# Altium schematic symbol library jlcpcb_2025_04_inductors_extended_0805.schlib: 882 symbols (part 1 of 5) (continued)
## CMI201209X5R6KT
designator L?  Inductance: 5.6uH
Inductor, 5.6uH, ±10%, 1Ω, 25mA, SMD 0805; Manufacturer: FH(Guangdong Fenghua Advanced Tech); Manufacturer Part Number: CMI201209X5R6KT; Self-Resonant Frequency: 32MHz; Q Factor: 30@4MHz; Package Size: 0805; JLCPCB Basic Part: No; JLCPCB Part Number: C1045; Supplier 1: LCSC; Category: Inductors; Supplier Part Number 1: C1045; Tolerance: ±10%; Rated Current: 25mA; DC Resistance: 1Ω; RoHS: Yes; ComponentLink1Description: Datasheet; ComponentLink1URL: https://wmsc.lcsc.com/wmsc/upload/file/pdf/v2/lcsc/2302231101_FH--Guangdong-Fenghua-Advanced-Tech-CMI201209X5R6KT_C1045.pdf; ComponentLink2Description: JLCPCB Part URL; ComponentLink2URL: https://jlcpcb.com/partdetail/C1045; ComponentLink3Description: LCSC Part URL; ComponentLink3URL: https://lcsc.com/product-detail/Inductors-SMD_FH-Guangdong-Fenghua-Advanced-Tech-FH-Guangdong-Fenghua-Advanced-Tech-CMI201209X5R6KT_C1045.html
footprint IND-0805 (0805 (2012M) Inductor)
pins: 1, 2

## CMI201209X6R8KT
designator L?  Inductance: 6.8uH
Inductor, 6.8uH, ±10%, 1.05Ω, 15mA, SMD 0805; Manufacturer: FH(Guangdong Fenghua Advanced Tech); Manufacturer Part Number: CMI201209X6R8KT; Self-Resonant Frequency: 29MHz; Q Factor: 30@4MHz; Package Size: 0805; JLCPCB Basic Part: No; JLCPCB Part Number: C139232; Supplier 1: LCSC; Category: Inductors; Supplier Part Number 1: C139232; Tolerance: ±10%; Rated Current: 15mA; DC Resistance: 1.05Ω; RoHS: Yes; ComponentLink1Description: Datasheet; ComponentLink1URL: https://wmsc.lcsc.com/wmsc/upload/file/pdf/v2/lcsc/2302231230_FH--Guangdong-Fenghua-Advanced-Tech-CMI201209X6R8KT_C139232.pdf; ComponentLink2Description: JLCPCB Part URL; ComponentLink2URL: https://jlcpcb.com/partdetail/C139232; ComponentLink3Description: LCSC Part URL; ComponentLink3URL: https://lcsc.com/product-detail/Inductors-SMD_FH-Guangdong-Fenghua-Advanced-Tech-FH-Guangdong-Fenghua-Advanced-Tech-CMI201209X6R8KT_C139232.html
footprint IND-0805 (0805 (2012M) Inductor)
pins: 1, 2

## CMI201209X8R2KT
designator L?  Inductance: 8.2uH
Inductor, 8.2uH, ±10%, 1.05Ω, 5mA, SMD 0805; Manufacturer: FH(Guangdong Fenghua Advanced Tech); Manufacturer Part Number: CMI201209X8R2KT; Self-Resonant Frequency: 26MHz; Q Factor: 30@4MHz; Package Size: 0805; JLCPCB Basic Part: No; JLCPCB Part Number: C139233; Supplier 1: LCSC; Category: Inductors; Supplier Part Number 1: C139233; Tolerance: ±10%; Rated Current: 5mA; DC Resistance: 1.05Ω; RoHS: Yes; ComponentLink1Description: Datasheet; ComponentLink1URL: https://wmsc.lcsc.com/wmsc/upload/file/pdf/v2/lcsc/2302231230_FH--Guangdong-Fenghua-Advanced-Tech-CMI201209X8R2KT_C139233.pdf; ComponentLink2Description: JLCPCB Part URL; ComponentLink2URL: https://jlcpcb.com/partdetail/C139233; ComponentLink3Description: LCSC Part URL; ComponentLink3URL: https://lcsc.com/product-detail/Inductors-SMD_FH-Guangdong-Fenghua-Advanced-Tech-FH-Guangdong-Fenghua-Advanced-Tech-CMI201209X8R2KT_C139233.html
footprint IND-0805 (0805 (2012M) Inductor)
pins: 1, 2

## CMI201209X100KT
designator L?  Inductance: 10uH
Inductor, 10uH, ±10%, 1.15Ω, 15mA, SMD 0805; Manufacturer: FH(Guangdong Fenghua Advanced Tech); Manufacturer Part Number: CMI201209X100KT; Self-Resonant Frequency: 24MHz; Q Factor: 30@2MHz; Package Size: 0805; JLCPCB Basic Part: No; JLCPCB Part Number: C99366; Supplier 1: LCSC; Category: Inductors; Supplier Part Number 1: C99366; Tolerance: ±10%; Rated Current: 15mA; DC Resistance: 1.15Ω; RoHS: Yes; ComponentLink1Description: Datasheet; ComponentLink1URL: https://wmsc.lcsc.com/wmsc/upload/file/pdf/v2/lcsc/2302231230_FH--Guangdong-Fenghua-Advanced-Tech-CMI201209X100KT_C99366.pdf; ComponentLink2Description: JLCPCB Part URL; ComponentLink2URL: https://jlcpcb.com/partdetail/C99366; ComponentLink3Description: LCSC Part URL; ComponentLink3URL: https://lcsc.com/product-detail/Inductors-SMD_FH-Guangdong-Fenghua-Advanced-Tech-FH-Guangdong-Fenghua-Advanced-Tech-CMI201209X100KT_C99366.html
footprint IND-0805 (0805 (2012M) Inductor)
pins: 1, 2

## CMI201209X120KT
designator L?  Inductance: 12uH
Inductor, 12uH, ±10%, 1.15Ω, 15mA, SMD 0805; Manufacturer: FH(Guangdong Fenghua Advanced Tech); Manufacturer Part Number: CMI201209X120KT; Self-Resonant Frequency: 22MHz; Q Factor: 30@2MHz; Package Size: 0805; JLCPCB Basic Part: No; JLCPCB Part Number: C268319; Supplier 1: LCSC; Category: Inductors; Supplier Part Number 1: C268319; Tolerance: ±10%; Rated Current: 15mA; DC Resistance: 1.15Ω; RoHS: Yes; ComponentLink1Description: Datasheet; ComponentLink1URL: https://wmsc.lcsc.com/wmsc/upload/file/pdf/v2/lcsc/2302231230_FH--Guangdong-Fenghua-Advanced-Tech-CMI201209X120KT_C268319.pdf; ComponentLink2Description: JLCPCB Part URL; ComponentLink2URL: https://jlcpcb.com/partdetail/C268319; ComponentLink3Description: LCSC Part URL; ComponentLink3URL: https://lcsc.com/product-detail/Inductors-SMD_FH-Guangdong-Fenghua-Advanced-Tech-FH-Guangdong-Fenghua-Advanced-Tech-CMI201209X120KT_C268319.html
footprint IND-0805 (0805 (2012M) Inductor)
pins: 1, 2

## CMI201212J390KT
designator L?  Inductance: 39uH
Inductor, 39uH, ±10%, SMD 0805; Manufacturer: FH (Guangdong Fenghua Advanced Tech); Manufacturer Part Number: CMI201212J390KT; Package Size: 0805; JLCPCB Basic Part: No; JLCPCB Part Number: C394973; Supplier 1: LCSC; Category: Inductors; Supplier Part Number 1: C394973; Tolerance: ±10%; RoHS: Yes; ComponentLink1Description: Datasheet; ComponentLink1URL: https://wmsc.lcsc.com/wmsc/upload/file/pdf/v2/lcsc/2302231030_FH--Guangdong-Fenghua-Advanced-Tech-CMI201212J390KT_C394973.pdf; ComponentLink2Description: JLCPCB Part URL; ComponentLink2URL: https://jlcpcb.com/partdetail/C394973; ComponentLink3Description: LCSC Part URL; ComponentLink3URL: https://lcsc.com/product-detail/Inductors-SMD_FH-Guangdong-Fenghua-Advanced-Tech-FH-Guangdong-Fenghua-Advanced-Tech-CMI201212J390KT_C394973.html
footprint IND-0805 (0805 (2012M) Inductor)
pins: 1, 2

## CMI201212J470KT
designator L?  Inductance: 47uH
Inductor, 47uH, ±10%, SMD 0805; Manufacturer: FH(Guangdong Fenghua Advanced Tech); Manufacturer Part Number: CMI201212J470KT; Package Size: 0805; JLCPCB Basic Part: No; JLCPCB Part Number: C105499; Supplier 1: LCSC; Category: Inductors; Supplier Part Number 1: C105499; Tolerance: ±10%; RoHS: Yes; ComponentLink1Description: Datasheet; ComponentLink1URL: https://wmsc.lcsc.com/wmsc/upload/file/pdf/v2/lcsc/2302231030_FH--Guangdong-Fenghua-Advanced-Tech-CMI201212J470KT_C105499.pdf; ComponentLink2Description: JLCPCB Part URL; ComponentLink2URL: https://jlcpcb.com/partdetail/C105499; ComponentLink3Description: LCSC Part URL; ComponentLink3URL: https://lcsc.com/product-detail/Inductors-SMD_FH-Guangdong-Fenghua-Advanced-Tech-FH-Guangdong-Fenghua-Advanced-Tech-CMI201212J470KT_C105499.html
footprint IND-0805 (0805 (2012M) Inductor)
pins: 1, 2

## CMP201209JD150MT
designator L?  Inductance: 15uH
Inductor, 15uH, ±20%, 650mΩ, 100mA, SMD 0805; Manufacturer: FH (Guangdong Fenghua Advanced Tech); Manufacturer Part Number: CMP201209JD150MT; Self-Resonant Frequency: 19MHz; Package Size: 0805; JLCPCB Basic Part: No; JLCPCB Part Number: C5344252; Supplier 1: LCSC; Category: Inductors; Supplier Part Number 1: C5344252; Tolerance: ±20%; Rated Current: 100mA; DC Resistance: 650mΩ; RoHS: Yes; ComponentLink1Description: Datasheet; ComponentLink1URL: https://wmsc.lcsc.com/wmsc/upload/file/pdf/v2/lcsc/2302231130_FH--Guangdong-Fenghua-Advanced-Tech-CMP201209JD150MT_C5344252.pdf; ComponentLink2Description: JLCPCB Part URL; ComponentLink2URL: https://jlcpcb.com/partdetail/C5344252; ComponentLink3Description: LCSC Part URL; ComponentLink3URL: https://lcsc.com/product-detail/Inductors-SMD_FH-Guangdong-Fenghua-Advanced-Tech-FH-Guangdong-Fenghua-Advanced-Tech-CMP201209JD150MT_C5344252.html
footprint IND-0805 (0805 (2012M) Inductor)
pins: 1, 2

## CMP201209JE220MT
designator L?  Inductance: 22uH
Inductor, 22uH, ±20%, 750mΩ, 50mA, SMD 0805; Manufacturer: FH(Guangdong Fenghua Advanced Tech); Manufacturer Part Number: CMP201209JE220MT; Self-Resonant Frequency: 16MHz; Package Size: 0805; JLCPCB Basic Part: No; JLCPCB Part Number: C395011; Supplier 1: LCSC; Category: Inductors; Supplier Part Number 1: C395011; Tolerance: ±20%; Rated Current: 50mA; DC Resistance: 750mΩ; RoHS: Yes; ComponentLink1Description: Datasheet; ComponentLink1URL: https://wmsc.lcsc.com/wmsc/upload/file/pdf/v2/lcsc/2302231030_FH--Guangdong-Fenghua-Advanced-Tech-CMP201209JE220MT_C395011.pdf; ComponentLink2Description: JLCPCB Part URL; ComponentLink2URL: https://jlcpcb.com/partdetail/C395011; ComponentLink3Description: LCSC Part URL; ComponentLink3URL: https://lcsc.com/product-detail/Inductors-SMD_FH-Guangdong-Fenghua-Advanced-Tech-FH-Guangdong-Fenghua-Advanced-Tech-CMP201209JE220MT_C395011.html
footprint IND-0805 (0805 (2012M) Inductor)
pins: 1, 2

## CMP201209UD1R0KT
designator L?  Inductance: 1uH
Inductor, 1uH, ±10%, SMD 0805; Manufacturer: FH(Guangdong Fenghua Advanced Tech); Manufacturer Part Number: CMP201209UD1R0KT; Package Size: 0805; JLCPCB Basic Part: No; JLCPCB Part Number: C395012; Supplier 1: LCSC; Category: Inductors; Supplier Part Number 1: C395012; Tolerance: ±10%; RoHS: Yes; ComponentLink1Description: Datasheet; ComponentLink1URL: https://wmsc.lcsc.com/wmsc/upload/file/pdf/v2/lcsc/2304140030_FH--Guangdong-Fenghua-Advanced-Tech-CMP201209UD1R0KT_C395012.pdf; ComponentLink2Description: JLCPCB Part URL; ComponentLink2URL: https://jlcpcb.com/partdetail/C395012; ComponentLink3Description: LCSC Part URL; ComponentLink3URL: https://lcsc.com/product-detail/Inductors-SMD_FH-Guangdong-Fenghua-Advanced-Tech-FH-Guangdong-Fenghua-Advanced-Tech-CMP201209UD1R0KT_C395012.html
footprint IND-0805 (0805 (2012M) Inductor)
pins: 1, 2

## CMP201209UD1R0MT
designator L?  Inductance: 1uH
Inductor, 1uH, ±20%, 240mΩ, 800mA, SMD 0805; Manufacturer: FH(Guangdong Fenghua Advanced Tech); Manufacturer Part Number: CMP201209UD1R0MT; Self-Resonant Frequency: 75MHz; Package Size: 0805; JLCPCB Basic Part: No; JLCPCB Part Number: C401475; Supplier 1: LCSC; Category: Inductors; Supplier Part Number 1: C401475; Tolerance: ±20%; Rated Current: 800mA; DC Resistance: 240mΩ; RoHS: Yes; ComponentLink1Description: Datasheet; ComponentLink1URL: https://wmsc.lcsc.com/wmsc/upload/file/pdf/v2/lcsc/2302231130_FH--Guangdong-Fenghua-Advanced-Tech-CMP201209UD1R0MT_C401475.pdf; ComponentLink2Description: JLCPCB Part URL; ComponentLink2URL: https://jlcpcb.com/partdetail/C401475; ComponentLink3Description: LCSC Part URL; ComponentLink3URL: https://lcsc.com/product-detail/Inductors-SMD_FH-Guangdong-Fenghua-Advanced-Tech-FH-Guangdong-Fenghua-Advanced-Tech-CMP201209UD1R0MT_C401475.html
footprint IND-0805 (0805 (2012M) Inductor)
pins: 1, 2

## CMP201209UD1R5MT
designator L?  Inductance: 1.5uH
Inductor, 1.5uH, ±20%, 300mΩ, 700mA, SMD 0805; Manufacturer: FH(Guangdong Fenghua Advanced Tech); Manufacturer Part Number: CMP201209UD1R5MT; Self-Resonant Frequency: 60MHz; Package Size: 0805; JLCPCB Basic Part: No; JLCPCB Part Number: C395013; Supplier 1: LCSC; Category: Inductors; Supplier Part Number 1: C395013; Tolerance: ±20%; Rated Current: 700mA; DC Resistance: 300mΩ; RoHS: Yes; ComponentLink1Description: Datasheet; ComponentLink1URL: https://wmsc.lcsc.com/wmsc/upload/file/pdf/v2/lcsc/2302231030_FH--Guangdong-Fenghua-Advanced-Tech-CMP201209UD1R5MT_C395013.pdf; ComponentLink2Description: JLCPCB Part URL; ComponentLink2URL: https://jlcpcb.com/partdetail/C395013; ComponentLink3Description: LCSC Part URL; ComponentLink3URL: https://lcsc.com/product-detail/Inductors-SMD_FH-Guangdong-Fenghua-Advanced-Tech-FH-Guangdong-Fenghua-Advanced-Tech-CMP201209UD1R5MT_C395013.html
footprint IND-0805 (0805 (2012M) Inductor)
pins: 1, 2

## CMP201209UD2R2KT
designator L?  Inductance: 2.2uH
Inductor, 2.2uH, ±10%, SMD 0805; Manufacturer: FH(Guangdong Fenghua Advanced Tech); Manufacturer Part Number: CMP201209UD2R2KT; Package Size: 0805; JLCPCB Basic Part: No; JLCPCB Part Number: C395014; Supplier 1: LCSC; Category: Inductors; Supplier Part Number 1: C395014; Tolerance: ±10%; RoHS: Yes; ComponentLink1Description: Datasheet; ComponentLink1URL: https://wmsc.lcsc.com/wmsc/upload/file/pdf/v2/lcsc/1912111437_FH--Guangdong-Fenghua-Advanced-Tech-CMP201209UD2R2KT_C395014.pdf; ComponentLink2Description: JLCPCB Part URL; ComponentLink2URL: https://jlcpcb.com/partdetail/C395014; ComponentLink3Description: LCSC Part URL; ComponentLink3URL: https://lcsc.com/product-detail/Inductors-SMD_FH-Guangdong-Fenghua-Advanced-Tech-FH-Guangdong-Fenghua-Advanced-Tech-CMP201209UD2R2KT_C395014.html
footprint IND-0805 (0805 (2012M) Inductor)
pins: 1, 2

## CMP201209UD2R2MT
designator L?  Inductance: 2.2uH
Inductor, 2.2uH, ±20%, 360mΩ, 600mA, SMD 0805; Manufacturer: FH(Guangdong Fenghua Advanced Tech); Manufacturer Part Number: CMP201209UD2R2MT; Self-Resonant Frequency: 50MHz; Package Size: 0805; JLCPCB Basic Part: No; JLCPCB Part Number: C139241; Supplier 1: LCSC; Category: Inductors; Supplier Part Number 1: C139241; Tolerance: ±20%; Rated Current: 600mA; DC Resistance: 360mΩ; RoHS: Yes; ComponentLink1Description: Datasheet; ComponentLink1URL: https://wmsc.lcsc.com/wmsc/upload/file/pdf/v2/lcsc/2302231230_FH--Guangdong-Fenghua-Advanced-Tech-CMP201209UD2R2MT_C139241.pdf; ComponentLink2Description: JLCPCB Part URL; ComponentLink2URL: https://jlcpcb.com/partdetail/C139241; ComponentLink3Description: LCSC Part URL; ComponentLink3URL: https://lcsc.com/product-detail/Inductors-SMD_FH-Guangdong-Fenghua-Advanced-Tech-FH-Guangdong-Fenghua-Advanced-Tech-CMP201209UD2R2MT_C139241.html
footprint IND-0805 (0805 (2012M) Inductor)
pins: 1, 2

## CMP201209UD2R7MT
designator L?  Inductance: 2.7uH
Inductor, 2.7uH, ±20%, 360mΩ, 600mA, SMD 0805; Manufacturer: FH(Guangdong Fenghua Advanced Tech); Manufacturer Part Number: CMP201209UD2R7MT; Self-Resonant Frequency: 45MHz; Package Size: 0805; JLCPCB Basic Part: No; JLCPCB Part Number: C395015; Supplier 1: LCSC; Category: Inductors; Supplier Part Number 1: C395015; Tolerance: ±20%; Rated Current: 600mA; DC Resistance: 360mΩ; RoHS: Yes; ComponentLink1Description: Datasheet; ComponentLink1URL: https://wmsc.lcsc.com/wmsc/upload/file/pdf/v2/lcsc/2302231030_FH--Guangdong-Fenghua-Advanced-Tech-CMP201209UD2R7MT_C395015.pdf; ComponentLink2Description: JLCPCB Part URL; ComponentLink2URL: https://jlcpcb.com/partdetail/C395015; ComponentLink3Description: LCSC Part URL; ComponentLink3URL: https://lcsc.com/product-detail/Inductors-SMD_FH-Guangdong-Fenghua-Advanced-Tech-FH-Guangdong-Fenghua-Advanced-Tech-CMP201209UD2R7MT_C395015.html
footprint IND-0805 (0805 (2012M) Inductor)
pins: 1, 2

## CMP201209UD3R3MT
designator L?  Inductance: 3.3uH
Inductor, 3.3uH, ±20%, 400mΩ, 350mA, SMD 0805; Manufacturer: FH(Guangdong Fenghua Advanced Tech); Manufacturer Part Number: CMP201209UD3R3MT; Self-Resonant Frequency: 41MHz; Package Size: 0805; JLCPCB Basic Part: No; JLCPCB Part Number: C139242; Supplier 1: LCSC; Category: Inductors; Supplier Part Number 1: C139242; Tolerance: ±20%; Rated Current: 350mA; DC Resistance: 400mΩ; RoHS: Yes; ComponentLink1Description: Datasheet; ComponentLink1URL: https://wmsc.lcsc.com/wmsc/upload/file/pdf/v2/lcsc/2302231230_FH--Guangdong-Fenghua-Advanced-Tech-CMP201209UD3R3MT_C139242.pdf; ComponentLink2Description: JLCPCB Part URL; ComponentLink2URL: https://jlcpcb.com/partdetail/C139242; ComponentLink3Description: LCSC Part URL; ComponentLink3URL: https://lcsc.com/product-detail/Inductors-SMD_FH-Guangdong-Fenghua-Advanced-Tech-FH-Guangdong-Fenghua-Advanced-Tech-CMP201209UD3R3MT_C139242.html
footprint IND-0805 (0805 (2012M) Inductor)
pins: 1, 2

## CMP201209UD4R7KT
designator L?  Inductance: 4.7uH
Inductor, 4.7uH, ±10%, SMD 0805; Manufacturer: FH(Guangdong Fenghua Advanced Tech); Manufacturer Part Number: CMP201209UD4R7KT; Package Size: 0805; JLCPCB Basic Part: No; JLCPCB Part Number: C395016; Supplier 1: LCSC; Category: Inductors; Supplier Part Number 1: C395016; Tolerance: ±10%; RoHS: Yes; ComponentLink1Description: Datasheet; ComponentLink1URL: https://wmsc.lcsc.com/wmsc/upload/file/pdf/v2/lcsc/2304140030_FH--Guangdong-Fenghua-Advanced-Tech-CMP201209UD4R7KT_C395016.pdf; ComponentLink2Description: JLCPCB Part URL; ComponentLink2URL: https://jlcpcb.com/partdetail/C395016; ComponentLink3Description: LCSC Part URL; ComponentLink3URL: https://lcsc.com/product-detail/Inductors-SMD_FH-Guangdong-Fenghua-Advanced-Tech-FH-Guangdong-Fenghua-Advanced-Tech-CMP201209UD4R7KT_C395016.html
footprint IND-0805 (0805 (2012M) Inductor)
pins: 1, 2

## CMP201209UD4R7MT
designator L?  Inductance: 4.7uH
Inductor, 4.7uH, ±20%, 400mΩ, 350mA, SMD 0805; Manufacturer: FH(Guangdong Fenghua Advanced Tech); Manufacturer Part Number: CMP201209UD4R7MT; Self-Resonant Frequency: 35MHz; Package Size: 0805; JLCPCB Basic Part: No; JLCPCB Part Number: C139243; Supplier 1: LCSC; Category: Inductors; Supplier Part Number 1: C139243; Tolerance: ±20%; Rated Current: 350mA; DC Resistance: 400mΩ; RoHS: Yes; ComponentLink1Description: Datasheet; ComponentLink1URL: https://wmsc.lcsc.com/wmsc/upload/file/pdf/v2/lcsc/2302231230_FH--Guangdong-Fenghua-Advanced-Tech-CMP201209UD4R7MT_C139243.pdf; ComponentLink2Description: JLCPCB Part URL; ComponentLink2URL: https://jlcpcb.com/partdetail/C139243; ComponentLink3Description: LCSC Part URL; ComponentLink3URL: https://lcsc.com/product-detail/Inductors-SMD_FH-Guangdong-Fenghua-Advanced-Tech-FH-Guangdong-Fenghua-Advanced-Tech-CMP201209UD4R7MT_C139243.html
footprint IND-0805 (0805 (2012M) Inductor)
pins: 1, 2

## CMP201209UE3R3MT
designator L?  Inductance: 3.3uH
Inductor, 3.3uH, ±20%, 400mΩ, 120mA, SMD 0805; Manufacturer: FH(Guangdong Fenghua Advanced Tech); Manufacturer Part Number: CMP201209UE3R3MT; Self-Resonant Frequency: 41MHz; Package Size: 0805; JLCPCB Basic Part: No; JLCPCB Part Number: C139244; Supplier 1: LCSC; Category: Inductors; Supplier Part Number 1: C139244; Tolerance: ±20%; Rated Current: 120mA; DC Resistance: 400mΩ; RoHS: Yes; ComponentLink1Description: Datasheet; ComponentLink1URL: https://wmsc.lcsc.com/wmsc/upload/file/pdf/v2/lcsc/2302231230_FH--Guangdong-Fenghua-Advanced-Tech-CMP201209UE3R3MT_C139244.pdf; ComponentLink2Description: JLCPCB Part URL; ComponentLink2URL: https://jlcpcb.com/partdetail/C139244; ComponentLink3Description: LCSC Part URL; ComponentLink3URL: https://lcsc.com/product-detail/Inductors-SMD_FH-Guangdong-Fenghua-Advanced-Tech-FH-Guangdong-Fenghua-Advanced-Tech-CMP201209UE3R3MT_C139244.html
footprint IND-0805 (0805 (2012M) Inductor)
pins: 1, 2

## CMP201209XD5R6KT
designator L?  Inductance: 5.6uH
Inductor, 5.6uH, ±10%, SMD 0805; Manufacturer: FH(Guangdong Fenghua Advanced Tech); Manufacturer Part Number: CMP201209XD5R6KT; Package Size: 0805; JLCPCB Basic Part: No; JLCPCB Part Number: C139246; Supplier 1: LCSC; Category: Inductors; Supplier Part Number 1: C139246; Tolerance: ±10%; RoHS: Yes; ComponentLink1Description: Datasheet; ComponentLink1URL: https://wmsc.lcsc.com/wmsc/upload/file/pdf/v2/lcsc/2304140030_FH--Guangdong-Fenghua-Advanced-Tech-CMP201209XD5R6KT_C139246.pdf; ComponentLink2Description: JLCPCB Part URL; ComponentLink2URL: https://jlcpcb.com/partdetail/C139246; ComponentLink3Description: LCSC Part URL; ComponentLink3URL: https://lcsc.com/product-detail/Inductors-SMD_FH-Guangdong-Fenghua-Advanced-Tech-FH-Guangdong-Fenghua-Advanced-Tech-CMP201209XD5R6KT_C139246.html
footprint IND-0805 (0805 (2012M) Inductor)
pins: 1, 2

## CMP201209XD5R6MT
designator L?  Inductance: 5.6uH
Inductor, 5.6uH, ±20%, 500mΩ, 250mA, SMD 0805; Manufacturer: FH(Guangdong Fenghua Advanced Tech); Manufacturer Part Number: CMP201209XD5R6MT; Self-Resonant Frequency: 32MHz; Package Size: 0805; JLCPCB Basic Part: No; JLCPCB Part Number: C395017; Supplier 1: LCSC; Category: Inductors; Supplier Part Number 1: C395017; Tolerance: ±20%; Rated Current: 250mA; DC Resistance: 500mΩ; RoHS: Yes; ComponentLink1Description: Datasheet; ComponentLink1URL: https://wmsc.lcsc.com/wmsc/upload/file/pdf/v2/lcsc/2302231030_FH--Guangdong-Fenghua-Advanced-Tech-CMP201209XD5R6MT_C395017.pdf; ComponentLink2Description: JLCPCB Part URL; ComponentLink2URL: https://jlcpcb.com/partdetail/C395017; ComponentLink3Description: LCSC Part URL; ComponentLink3URL: https://lcsc.com/product-detail/Inductors-SMD_FH-Guangdong-Fenghua-Advanced-Tech-FH-Guangdong-Fenghua-Advanced-Tech-CMP201209XD5R6MT_C395017.html
footprint IND-0805 (0805 (2012M) Inductor)
pins: 1, 2

## CMP201209XD6R8KT
designator L?  Inductance: 6.8uH
Inductor, 6.8uH, ±10%, SMD 0805; Manufacturer: FH(Guangdong Fenghua Advanced Tech); Manufacturer Part Number: CMP201209XD6R8KT; Package Size: 0805; JLCPCB Basic Part: No; JLCPCB Part Number: C139247; Supplier 1: LCSC; Category: Inductors; Supplier Part Number 1: C139247; Tolerance: ±10%; RoHS: Yes; ComponentLink1Description: Datasheet; ComponentLink1URL: https://wmsc.lcsc.com/wmsc/upload/file/pdf/v2/lcsc/2304140030_FH--Guangdong-Fenghua-Advanced-Tech-CMP201209XD6R8KT_C139247.pdf; ComponentLink2Description: JLCPCB Part URL; ComponentLink2URL: https://jlcpcb.com/partdetail/C139247; ComponentLink3Description: LCSC Part URL; ComponentLink3URL: https://lcsc.com/product-detail/Inductors-SMD_FH-Guangdong-Fenghua-Advanced-Tech-FH-Guangdong-Fenghua-Advanced-Tech-CMP201209XD6R8KT_C139247.html
footprint IND-0805 (0805 (2012M) Inductor)
pins: 1, 2

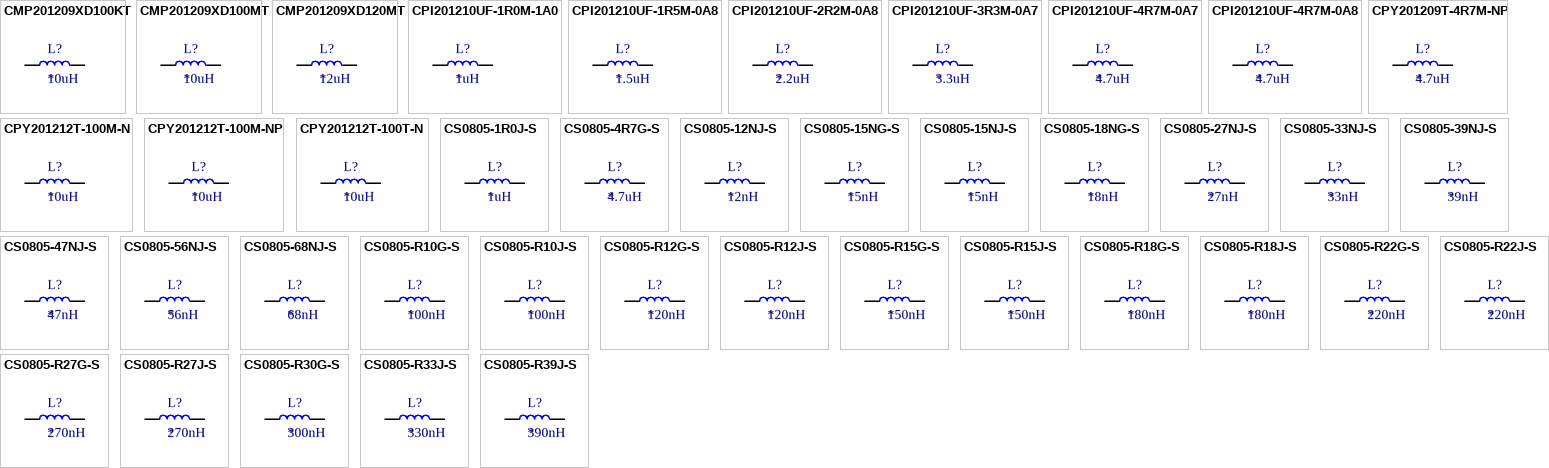
[diagram p4: symbols CMP201209XD100KT to CS0805-R39J-S]

## CMP201209XD100KT
designator L?  Inductance: 10uH
Inductor, 10uH, ±10%, SMD 0805; Manufacturer: FH(Guangdong Fenghua Advanced Tech); Manufacturer Part Number: CMP201209XD100KT; Package Size: 0805; JLCPCB Basic Part: No; JLCPCB Part Number: C395018; Supplier 1: LCSC; Category: Inductors; Supplier Part Number 1: C395018; Tolerance: ±10%; RoHS: Yes; ComponentLink1Description: Datasheet; ComponentLink1URL: https://wmsc.lcsc.com/wmsc/upload/file/pdf/v2/lcsc/2304140030_FH--Guangdong-Fenghua-Advanced-Tech-CMP201209XD100KT_C395018.pdf; ComponentLink2Description: JLCPCB Part URL; ComponentLink2URL: https://jlcpcb.com/partdetail/C395018; ComponentLink3Description: LCSC Part URL; ComponentLink3URL: https://lcsc.com/product-detail/Inductors-SMD_FH-Guangdong-Fenghua-Advanced-Tech-FH-Guangdong-Fenghua-Advanced-Tech-CMP201209XD100KT_C395018.html
footprint IND-0805 (0805 (2012M) Inductor)
pins: 1, 2

## CMP201209XD100MT
designator L?  Inductance: 10uH
Inductor, 10uH, ±20%, 560mΩ, 250mA, SMD 0805; Manufacturer: FH(Guangdong Fenghua Advanced Tech); Manufacturer Part Number: CMP201209XD100MT; Self-Resonant Frequency: 24MHz; Package Size: 0805; JLCPCB Basic Part: No; JLCPCB Part Number: C139245; Supplier 1: LCSC; Category: Inductors; Supplier Part Number 1: C139245; Tolerance: ±20%; Rated Current: 250mA; DC Resistance: 560mΩ; RoHS: Yes; ComponentLink1Description: Datasheet; ComponentLink1URL: https://wmsc.lcsc.com/wmsc/upload/file/pdf/v2/lcsc/2302231230_FH--Guangdong-Fenghua-Advanced-Tech-CMP201209XD100MT_C139245.pdf; ComponentLink2Description: JLCPCB Part URL; ComponentLink2URL: https://jlcpcb.com/partdetail/C139245; ComponentLink3Description: LCSC Part URL; ComponentLink3URL: https://lcsc.com/product-detail/Inductors-SMD_FH-Guangdong-Fenghua-Advanced-Tech-FH-Guangdong-Fenghua-Advanced-Tech-CMP201209XD100MT_C139245.html
footprint IND-0805 (0805 (2012M) Inductor)
pins: 1, 2

## CMP201209XD120MT
designator L?  Inductance: 12uH
Inductor, 12uH, ±20%, 560mΩ, 250mA, SMD 0805; Manufacturer: FH(Guangdong Fenghua Advanced Tech); Manufacturer Part Number: CMP201209XD120MT; Self-Resonant Frequency: 22MHz; Package Size: 0805; JLCPCB Basic Part: No; JLCPCB Part Number: C395019; Supplier 1: LCSC; Category: Inductors; Supplier Part Number 1: C395019; Tolerance: ±20%; Rated Current: 250mA; DC Resistance: 560mΩ; RoHS: Yes; ComponentLink1Description: Datasheet; ComponentLink1URL: https://wmsc.lcsc.com/wmsc/upload/file/pdf/v2/lcsc/2302231208_FH--Guangdong-Fenghua-Advanced-Tech-CMP201209XD120MT_C395019.pdf; ComponentLink2Description: JLCPCB Part URL; ComponentLink2URL: https://jlcpcb.com/partdetail/C395019; ComponentLink3Description: LCSC Part URL; ComponentLink3URL: https://lcsc.com/product-detail/Inductors-SMD_FH-Guangdong-Fenghua-Advanced-Tech-FH-Guangdong-Fenghua-Advanced-Tech-CMP201209XD120MT_C395019.html
footprint IND-0805 (0805 (2012M) Inductor)
pins: 1, 2

## CPI201210UF-1R0M-1A0
designator L?  Inductance: 1uH
Inductor, 1uH, ±20%, 110mΩ, 1A, SMD 0805; Manufacturer: TAI-TECH; Manufacturer Part Number: CPI201210UF-1R0M-1A0; Package Size: 0805; JLCPCB Basic Part: No; JLCPCB Part Number: C2880052; Supplier 1: LCSC; Category: Inductors; Supplier Part Number 1: C2880052; Tolerance: ±20%; Rated Current: 1A; DC Resistance: 110mΩ; RoHS: Yes; ComponentLink1Description: Datasheet; ComponentLink1URL: https://wmsc.lcsc.com/wmsc/upload/file/pdf/v2/lcsc/2108241130_TAI-TECH-CPI201210UF-1R0M-1A0_C2880052.pdf; ComponentLink2Description: JLCPCB Part URL; ComponentLink2URL: https://jlcpcb.com/partdetail/C2880052; ComponentLink3Description: LCSC Part URL; ComponentLink3URL: https://lcsc.com/product-detail/Inductors-SMD_TAI-TECH-TAI-TECH-CPI201210UF-1R0M-1A0_C2880052.html
footprint IND-0805 (0805 (2012M) Inductor)
pins: 1, 2

## CPI201210UF-1R5M-0A8
designator L?  Inductance: 1.5uH
Inductor, 1.5uH, ±20%, 150mΩ, 800mA, SMD 0805; Manufacturer: TAI-TECH; Manufacturer Part Number: CPI201210UF-1R5M-0A8; Package Size: 0805; JLCPCB Basic Part: No; JLCPCB Part Number: C356837; Supplier 1: LCSC; Category: Inductors; Supplier Part Number 1: C356837; Tolerance: ±20%; Rated Current: 800mA; DC Resistance: 150mΩ; RoHS: Yes; ComponentLink1Description: Datasheet; ComponentLink1URL: https://wmsc.lcsc.com/wmsc/upload/file/pdf/v2/lcsc/2009171106_TAI-TECH-CPI201210UF-1R5M-0A8_C356837.pdf; ComponentLink2Description: JLCPCB Part URL; ComponentLink2URL: https://jlcpcb.com/partdetail/C356837; ComponentLink3Description: LCSC Part URL; ComponentLink3URL: https://lcsc.com/product-detail/Inductors-SMD_TAI-TECH-TAI-TECH-CPI201210UF-1R5M-0A8_C356837.html
footprint IND-0805 (0805 (2012M) Inductor)
pins: 1, 2

## CPI201210UF-2R2M-0A8
designator L?  Inductance: 2.2uH
Inductor, 2.2uH, ±20%, 150mΩ, 800mA, SMD 0805; Manufacturer: TAI-TECH; Manufacturer Part Number: CPI201210UF-2R2M-0A8; Package Size: 0805; JLCPCB Basic Part: No; JLCPCB Part Number: C356838; Supplier 1: LCSC; Category: Inductors; Supplier Part Number 1: C356838; Tolerance: ±20%; Rated Current: 800mA; DC Resistance: 150mΩ; RoHS: Yes; ComponentLink1Description: Datasheet; ComponentLink1URL: https://wmsc.lcsc.com/wmsc/upload/file/pdf/v2/lcsc/2009171106_TAI-TECH-CPI201210UF-2R2M-0A8_C356838.pdf; ComponentLink2Description: JLCPCB Part URL; ComponentLink2URL: https://jlcpcb.com/partdetail/C356838; ComponentLink3Description: LCSC Part URL; ComponentLink3URL: https://lcsc.com/product-detail/Inductors-SMD_TAI-TECH-TAI-TECH-CPI201210UF-2R2M-0A8_C356838.html
footprint IND-0805 (0805 (2012M) Inductor)
pins: 1, 2

## CPI201210UF-3R3M-0A7
designator L?  Inductance: 3.3uH
Inductor, 3.3uH, ±20%, 200mΩ, 700mA, SMD 0805; Manufacturer: TAI-TECH; Manufacturer Part Number: CPI201210UF-3R3M-0A7; Package Size: 0805; JLCPCB Basic Part: No; JLCPCB Part Number: C356839; Supplier 1: LCSC; Category: Inductors; Supplier Part Number 1: C356839; Tolerance: ±20%; Rated Current: 700mA; DC Resistance: 200mΩ; RoHS: Yes; ComponentLink1Description: Datasheet; ComponentLink1URL: https://wmsc.lcsc.com/wmsc/upload/file/pdf/v2/lcsc/2009171106_TAI-TECH-CPI201210UF-3R3M-0A7_C356839.pdf; ComponentLink2Description: JLCPCB Part URL; ComponentLink2URL: https://jlcpcb.com/partdetail/C356839; ComponentLink3Description: LCSC Part URL; ComponentLink3URL: https://lcsc.com/product-detail/Inductors-SMD_TAI-TECH-TAI-TECH-CPI201210UF-3R3M-0A7_C356839.html
footprint IND-0805 (0805 (2012M) Inductor)
pins: 1, 2

## CPI201210UF-4R7M-0A7
designator L?  Inductance: 4.7uH
Inductor, 4.7uH, ±20%, 230mΩ, 700mA, SMD 0805; Manufacturer: TAI-TECH; Manufacturer Part Number: CPI201210UF-4R7M-0A7; Package Size: 0805; JLCPCB Basic Part: No; JLCPCB Part Number: C356840; Supplier 1: LCSC; Category: Inductors; Supplier Part Number 1: C356840; Tolerance: ±20%; Rated Current: 700mA; DC Resistance: 230mΩ; RoHS: Yes; ComponentLink1Description: Datasheet; ComponentLink1URL: https://wmsc.lcsc.com/wmsc/upload/file/pdf/v2/lcsc/2009171106_TAI-TECH-CPI201210UF-4R7M-0A7_C356840.pdf; ComponentLink2Description: JLCPCB Part URL; ComponentLink2URL: https://jlcpcb.com/partdetail/C356840; ComponentLink3Description: LCSC Part URL; ComponentLink3URL: https://lcsc.com/product-detail/Inductors-SMD_TAI-TECH-TAI-TECH-CPI201210UF-4R7M-0A7_C356840.html
footprint IND-0805 (0805 (2012M) Inductor)
pins: 1, 2

## CPI201210UF-4R7M-0A8
designator L?  Inductance: 4.7uH
Inductor, 4.7uH, ±20%, 230mΩ, 800mA, SMD 0805; Manufacturer: TAI-TECH; Manufacturer Part Number: CPI201210UF-4R7M-0A8; Package Size: 0805; JLCPCB Basic Part: No; JLCPCB Part Number: C2880051; Supplier 1: LCSC; Category: Inductors; Supplier Part Number 1: C2880051; Tolerance: ±20%; Rated Current: 800mA; DC Resistance: 230mΩ; RoHS: Yes; ComponentLink1Description: Datasheet; ComponentLink1URL: https://wmsc.lcsc.com/wmsc/upload/file/pdf/v2/lcsc/2108241130_TAI-TECH-CPI201210UF-4R7M-0A8_C2880051.pdf; ComponentLink2Description: JLCPCB Part URL; ComponentLink2URL: https://jlcpcb.com/partdetail/C2880051; ComponentLink3Description: LCSC Part URL; ComponentLink3URL: https://lcsc.com/product-detail/Inductors-SMD_TAI-TECH-TAI-TECH-CPI201210UF-4R7M-0A8_C2880051.html
footprint IND-0805 (0805 (2012M) Inductor)
pins: 1, 2

## CPY201209T-4R7M-NP
designator L?  Inductance: 4.7uH
Inductor, 4.7uH, ±20%, SMD 0805; Manufacturer: Chilisin Elec; Manufacturer Part Number: CPY201209T-4R7M-NP; Package Size: 0805; JLCPCB Basic Part: No; JLCPCB Part Number: C285965; Supplier 1: LCSC; Category: Inductors; Supplier Part Number 1: C285965; Tolerance: ±20%; RoHS: Yes; ComponentLink1Description: Datasheet; ComponentLink1URL: https://wmsc.lcsc.com/wmsc/upload/file/pdf/v2/lcsc/2007201008_Chilisin-Elec-CPY201209T-4R7M-NP_C285965.pdf; ComponentLink2Description: JLCPCB Part URL; ComponentLink2URL: https://jlcpcb.com/partdetail/C285965; ComponentLink3Description: LCSC Part URL; ComponentLink3URL: https://lcsc.com/product-detail/Inductors-SMD_Chilisin-Elec-Chilisin-Elec-CPY201209T-4R7M-NP_C285965.html
footprint IND-0805 (0805 (2012M) Inductor)
pins: 1, 2

## CPY201212T-100M-N
designator L?  Inductance: 10uH
Inductor, 10uH, ±20%, SMD 0805; Manufacturer: Chilisin Elec; Manufacturer Part Number: CPY201212T-100M-N; Package Size: 0805; JLCPCB Basic Part: No; JLCPCB Part Number: C295680; Supplier 1: LCSC; Category: Inductors; Supplier Part Number 1: C295680; Tolerance: ±20%; RoHS: Yes; ComponentLink1Description: Datasheet; ComponentLink2Description: JLCPCB Part URL; ComponentLink2URL: https://jlcpcb.com/partdetail/C295680; ComponentLink3Description: LCSC Part URL; ComponentLink3URL: https://lcsc.com/product-detail/Inductors-SMD_Chilisin-Elec-Chilisin-Elec-CPY201212T-100M-N_C295680.html
footprint IND-0805 (0805 (2012M) Inductor)
pins: 1, 2

## CPY201212T-100M-NP
designator L?  Inductance: 10uH
Inductor, 10uH, ±20%, 400mA, SMD 0805; Manufacturer: Chilisin Elec; Manufacturer Part Number: CPY201212T-100M-NP; Package Size: 0805; JLCPCB Basic Part: No; JLCPCB Part Number: C285963; Supplier 1: LCSC; Category: Inductors; Supplier Part Number 1: C285963; Tolerance: ±20%; Rated Current: 400mA; RoHS: Yes; ComponentLink1Description: Datasheet; ComponentLink2Description: JLCPCB Part URL; ComponentLink2URL: https://jlcpcb.com/partdetail/C285963; ComponentLink3Description: LCSC Part URL; ComponentLink3URL: https://lcsc.com/product-detail/Inductors-SMD_Chilisin-Elec-Chilisin-Elec-CPY201212T-100M-NP_C285963.html
footprint IND-0805 (0805 (2012M) Inductor)
pins: 1, 2

## CPY201212T-100T-N
designator L?  Inductance: 10uH
Inductor, 10uH, ±30%, SMD 0805; Manufacturer: Chilisin Elec; Manufacturer Part Number: CPY201212T-100T-N; Package Size: 0805; JLCPCB Basic Part: No; JLCPCB Part Number: C285962; Supplier 1: LCSC; Category: Inductors; Supplier Part Number 1: C285962; Tolerance: ±30%; RoHS: Yes; ComponentLink1Description: Datasheet; ComponentLink2Description: JLCPCB Part URL; ComponentLink2URL: https://jlcpcb.com/partdetail/C285962; ComponentLink3Description: LCSC Part URL; ComponentLink3URL: https://lcsc.com/product-detail/Inductors-SMD_Chilisin-Elec-Chilisin-Elec-CPY201212T-100T-N_C285962.html
footprint IND-0805 (0805 (2012M) Inductor)
pins: 1, 2

## CS0805-1R0J-S
designator L?  Inductance: 1uH
Inductor, 1uH, ±5%, 2.5Ω, 170mA, SMD 0805; Manufacturer: Chilisin Elec; Manufacturer Part Number: CS0805-1R0J-S; Self-Resonant Frequency: 50MHz; Q Factor: 20@25MHz; Package Size: 0805; JLCPCB Basic Part: No; JLCPCB Part Number: C142164; Supplier 1: LCSC; Category: Inductors; Supplier Part Number 1: C142164; Tolerance: ±5%; Rated Current: 170mA; DC Resistance: 2.5Ω; RoHS: Yes; ComponentLink1Description: Datasheet; ComponentLink1URL: https://wmsc.lcsc.com/wmsc/upload/file/pdf/v2/lcsc/1810261322_Chilisin-Elec-CS0805-1R0J-S_C142164.pdf; ComponentLink2Description: JLCPCB Part URL; ComponentLink2URL: https://jlcpcb.com/partdetail/C142164; ComponentLink3Description: LCSC Part URL; ComponentLink3URL: https://lcsc.com/product-detail/Inductors-SMD_Chilisin-Elec-Chilisin-Elec-CS0805-1R0J-S_C142164.html
footprint IND-0805 (0805 (2012M) Inductor)
pins: 1, 2

## CS0805-4R7G-S
designator L?  Inductance: 4.7uH
Inductor, 4.7uH, ±2%, 6.4Ω, 90mA, SMD 0805; Manufacturer: Chilisin Elec; Manufacturer Part Number: CS0805-4R7G-S; Self-Resonant Frequency: 7.9MHz; Q Factor: 15@7.9MHz; Package Size: 0805; JLCPCB Basic Part: No; JLCPCB Part Number: C412887; Supplier 1: LCSC; Category: Inductors; Supplier Part Number 1: C412887; Tolerance: ±2%; Rated Current: 90mA; DC Resistance: 6.4Ω; RoHS: Yes; ComponentLink1Description: Datasheet; ComponentLink1URL: https://wmsc.lcsc.com/wmsc/upload/file/pdf/v2/lcsc/2304140030_Chilisin-Elec-CS0805-4R7G-S_C412887.pdf; ComponentLink2Description: JLCPCB Part URL; ComponentLink2URL: https://jlcpcb.com/partdetail/C412887; ComponentLink3Description: LCSC Part URL; ComponentLink3URL: https://lcsc.com/product-detail/Inductors-SMD_Chilisin-Elec-Chilisin-Elec-CS0805-4R7G-S_C412887.html
footprint IND-0805 (0805 (2012M) Inductor)
pins: 1, 2

## CS0805-12NJ-S
designator L?  Inductance: 12nH
Inductor, 12nH, ±5%, 150mΩ, 600mA, SMD 0805; Manufacturer: Chilisin Elec; Manufacturer Part Number: CS0805-12NJ-S; Self-Resonant Frequency: 500MHz; Q Factor: 50@250MHz; Package Size: 0805; JLCPCB Basic Part: No; JLCPCB Part Number: C373727; Supplier 1: LCSC; Category: Inductors; Supplier Part Number 1: C373727; Tolerance: ±5%; Rated Current: 600mA; DC Resistance: 150mΩ; RoHS: Yes; ComponentLink1Description: Datasheet; ComponentLink1URL: https://wmsc.lcsc.com/wmsc/upload/file/pdf/v2/lcsc/2304140030_Chilisin-Elec-CS0805-12NJ-S_C373727.pdf; ComponentLink2Description: JLCPCB Part URL; ComponentLink2URL: https://jlcpcb.com/partdetail/C373727; ComponentLink3Description: LCSC Part URL; ComponentLink3URL: https://lcsc.com/product-detail/Inductors-SMD_Chilisin-Elec-Chilisin-Elec-CS0805-12NJ-S_C373727.html
footprint IND-0805 (0805 (2012M) Inductor)
pins: 1, 2

## CS0805-15NG-S
designator L?  Inductance: 15nH
Inductor, 15nH, ±2%, 170mΩ, 600mA, SMD 0805; Manufacturer: Chilisin Elec; Manufacturer Part Number: CS0805-15NG-S; Self-Resonant Frequency: 500MHz; Q Factor: 50@250MHz; Package Size: 0805; JLCPCB Basic Part: No; JLCPCB Part Number: C412886; Supplier 1: LCSC; Category: Inductors; Supplier Part Number 1: C412886; Tolerance: ±2%; Rated Current: 600mA; DC Resistance: 170mΩ; RoHS: Yes; ComponentLink1Description: Datasheet; ComponentLink1URL: https://wmsc.lcsc.com/wmsc/upload/file/pdf/v2/lcsc/2304140030_Chilisin-Elec-CS0805-15NG-S_C412886.pdf; ComponentLink2Description: JLCPCB Part URL; ComponentLink2URL: https://jlcpcb.com/partdetail/C412886; ComponentLink3Description: LCSC Part URL; ComponentLink3URL: https://lcsc.com/product-detail/Inductors-SMD_Chilisin-Elec-Chilisin-Elec-CS0805-15NG-S_C412886.html
footprint IND-0805 (0805 (2012M) Inductor)
pins: 1, 2

## CS0805-15NJ-S
designator L?  Inductance: 15nH
Inductor, 15nH, ±5%, 170mΩ, 600mA, SMD 0805; Manufacturer: Chilisin Elec; Manufacturer Part Number: CS0805-15NJ-S; Self-Resonant Frequency: 500MHz; Q Factor: 50@250MHz; Package Size: 0805; JLCPCB Basic Part: No; JLCPCB Part Number: C373731; Supplier 1: LCSC; Category: Inductors; Supplier Part Number 1: C373731; Tolerance: ±5%; Rated Current: 600mA; DC Resistance: 170mΩ; RoHS: Yes; ComponentLink1Description: Datasheet; ComponentLink1URL: https://wmsc.lcsc.com/wmsc/upload/file/pdf/v2/lcsc/2304140030_Chilisin-Elec-CS0805-15NJ-S_C373731.pdf; ComponentLink2Description: JLCPCB Part URL; ComponentLink2URL: https://jlcpcb.com/partdetail/C373731; ComponentLink3Description: LCSC Part URL; ComponentLink3URL: https://lcsc.com/product-detail/Inductors-SMD_Chilisin-Elec-Chilisin-Elec-CS0805-15NJ-S_C373731.html
footprint IND-0805 (0805 (2012M) Inductor)
pins: 1, 2

## CS0805-18NG-S
designator L?  Inductance: 18nH
Inductor, 18nH, ±2%, 200mΩ, 600mA, SMD 0805; Manufacturer: Chilisin Elec; Manufacturer Part Number: CS0805-18NG-S; Self-Resonant Frequency: 500MHz; Q Factor: 50@250MHz; Package Size: 0805; JLCPCB Basic Part: No; JLCPCB Part Number: C320428; Supplier 1: LCSC; Category: Inductors; Supplier Part Number 1: C320428; Tolerance: ±2%; Rated Current: 600mA; DC Resistance: 200mΩ; RoHS: Yes; ComponentLink1Description: Datasheet; ComponentLink1URL: https://wmsc.lcsc.com/wmsc/upload/file/pdf/v2/lcsc/2304140030_Chilisin-Elec-CS0805-18NG-S_C320428.pdf; ComponentLink2Description: JLCPCB Part URL; ComponentLink2URL: https://jlcpcb.com/partdetail/C320428; ComponentLink3Description: LCSC Part URL; ComponentLink3URL: https://lcsc.com/product-detail/Inductors-SMD_Chilisin-Elec-Chilisin-Elec-CS0805-18NG-S_C320428.html
footprint IND-0805 (0805 (2012M) Inductor)
pins: 1, 2

## CS0805-27NJ-S
designator L?  Inductance: 27nH
Inductor, 27nH, ±5%, 250mΩ, 500mA, SMD 0805; Manufacturer: Chilisin Elec; Manufacturer Part Number: CS0805-27NJ-S; Self-Resonant Frequency: 500MHz; Q Factor: 55@250MHz; Package Size: 0805; JLCPCB Basic Part: No; JLCPCB Part Number: C373737; Supplier 1: LCSC; Category: Inductors; Supplier Part Number 1: C373737; Tolerance: ±5%; Rated Current: 500mA; DC Resistance: 250mΩ; RoHS: Yes; ComponentLink1Description: Datasheet; ComponentLink1URL: https://wmsc.lcsc.com/wmsc/upload/file/pdf/v2/lcsc/2304140030_Chilisin-Elec-CS0805-27NJ-S_C373737.pdf; ComponentLink2Description: JLCPCB Part URL; ComponentLink2URL: https://jlcpcb.com/partdetail/C373737; ComponentLink3Description: LCSC Part URL; ComponentLink3URL: https://lcsc.com/product-detail/Inductors-SMD_Chilisin-Elec-Chilisin-Elec-CS0805-27NJ-S_C373737.html
footprint IND-0805 (0805 (2012M) Inductor)
pins: 1, 2

## CS0805-33NJ-S
designator L?  Inductance: 33nH
Inductor, 33nH, ±5%, 270mΩ, 500mA, SMD 0805; Manufacturer: Chilisin Elec; Manufacturer Part Number: CS0805-33NJ-S; Self-Resonant Frequency: 500MHz; Q Factor: 60@250MHz; Package Size: 0805; JLCPCB Basic Part: No; JLCPCB Part Number: C373767; Supplier 1: LCSC; Category: Inductors; Supplier Part Number 1: C373767; Tolerance: ±5%; Rated Current: 500mA; DC Resistance: 270mΩ; RoHS: Yes; ComponentLink1Description: Datasheet; ComponentLink1URL: https://wmsc.lcsc.com/wmsc/upload/file/pdf/v2/lcsc/2304140030_Chilisin-Elec-CS0805-33NJ-S_C373767.pdf; ComponentLink2Description: JLCPCB Part URL; ComponentLink2URL: https://jlcpcb.com/partdetail/C373767; ComponentLink3Description: LCSC Part URL; ComponentLink3URL: https://lcsc.com/product-detail/Inductors-SMD_Chilisin-Elec-Chilisin-Elec-CS0805-33NJ-S_C373767.html
footprint IND-0805 (0805 (2012M) Inductor)
pins: 1, 2

## CS0805-39NJ-S
designator L?  Inductance: 39nH
Inductor, 39nH, ±5%, 290mΩ, 500mA, SMD 0805; Manufacturer: Chilisin Elec; Manufacturer Part Number: CS0805-39NJ-S; Self-Resonant Frequency: 500MHz; Q Factor: 60@250MHz; Package Size: 0805; JLCPCB Basic Part: No; JLCPCB Part Number: C373726; Supplier 1: LCSC; Category: Inductors; Supplier Part Number 1: C373726; Tolerance: ±5%; Rated Current: 500mA; DC Resistance: 290mΩ; RoHS: Yes; ComponentLink1Description: Datasheet; ComponentLink1URL: https://wmsc.lcsc.com/wmsc/upload/file/pdf/v2/lcsc/2304140030_Chilisin-Elec-CS0805-39NJ-S_C373726.pdf; ComponentLink2Description: JLCPCB Part URL; ComponentLink2URL: https://jlcpcb.com/partdetail/C373726; ComponentLink3Description: LCSC Part URL; ComponentLink3URL: https://lcsc.com/product-detail/Inductors-SMD_Chilisin-Elec-Chilisin-Elec-CS0805-39NJ-S_C373726.html
footprint IND-0805 (0805 (2012M) Inductor)
pins: 1, 2

## CS0805-47NJ-S
designator L?  Inductance: 47nH
Inductor, 47nH, ±5%, 310mΩ, 500mA, SMD 0805; Manufacturer: Chilisin Elec; Manufacturer Part Number: CS0805-47NJ-S; Self-Resonant Frequency: 500MHz; Q Factor: 60@200MHz; Package Size: 0805; JLCPCB Basic Part: No; JLCPCB Part Number: C373760; Supplier 1: LCSC; Category: Inductors; Supplier Part Number 1: C373760; Tolerance: ±5%; Rated Current: 500mA; DC Resistance: 310mΩ; RoHS: Yes; ComponentLink1Description: Datasheet; ComponentLink1URL: https://wmsc.lcsc.com/wmsc/upload/file/pdf/v2/lcsc/2304140030_Chilisin-Elec-CS0805-47NJ-S_C373760.pdf; ComponentLink2Description: JLCPCB Part URL; ComponentLink2URL: https://jlcpcb.com/partdetail/C373760; ComponentLink3Description: LCSC Part URL; ComponentLink3URL: https://lcsc.com/product-detail/Inductors-SMD_Chilisin-Elec-Chilisin-Elec-CS0805-47NJ-S_C373760.html
footprint IND-0805 (0805 (2012M) Inductor)
pins: 1, 2

## CS0805-56NJ-S
designator L?  Inductance: 56nH
Inductor, 56nH, ±5%, 340mΩ, 500mA, SMD 0805; Manufacturer: Chilisin Elec; Manufacturer Part Number: CS0805-56NJ-S; Self-Resonant Frequency: 500MHz; Q Factor: 60@200MHz; Package Size: 0805; JLCPCB Basic Part: No; JLCPCB Part Number: C373725; Supplier 1: LCSC; Category: Inductors; Supplier Part Number 1: C373725; Tolerance: ±5%; Rated Current: 500mA; DC Resistance: 340mΩ; RoHS: Yes; ComponentLink1Description: Datasheet; ComponentLink1URL: https://wmsc.lcsc.com/wmsc/upload/file/pdf/v2/lcsc/2304140030_Chilisin-Elec-CS0805-56NJ-S_C373725.pdf; ComponentLink2Description: JLCPCB Part URL; ComponentLink2URL: https://jlcpcb.com/partdetail/C373725; ComponentLink3Description: LCSC Part URL; ComponentLink3URL: https://lcsc.com/product-detail/Inductors-SMD_Chilisin-Elec-Chilisin-Elec-CS0805-56NJ-S_C373725.html
footprint IND-0805 (0805 (2012M) Inductor)
pins: 1, 2

## CS0805-68NJ-S
designator L?  Inductance: 68nH
Inductor, 68nH, ±5%, 380mΩ, 500mA, SMD 0805; Manufacturer: Chilisin Elec; Manufacturer Part Number: CS0805-68NJ-S; Self-Resonant Frequency: 500MHz; Q Factor: 60@200MHz; Package Size: 0805; JLCPCB Basic Part: No; JLCPCB Part Number: C285949; Supplier 1: LCSC; Category: Inductors; Supplier Part Number 1: C285949; Tolerance: ±5%; Rated Current: 500mA; DC Resistance: 380mΩ; RoHS: Yes; ComponentLink1Description: Datasheet; ComponentLink1URL: https://wmsc.lcsc.com/wmsc/upload/file/pdf/v2/lcsc/2304140030_Chilisin-Elec-CS0805-68NJ-S_C285949.pdf; ComponentLink2Description: JLCPCB Part URL; ComponentLink2URL: https://jlcpcb.com/partdetail/C285949; ComponentLink3Description: LCSC Part URL; ComponentLink3URL: https://lcsc.com/product-detail/Inductors-SMD_Chilisin-Elec-Chilisin-Elec-CS0805-68NJ-S_C285949.html
footprint IND-0805 (0805 (2012M) Inductor)
pins: 1, 2

## CS0805-R10G-S
designator L?  Inductance: 100nH
Inductor, 100nH, ±2%, 460mΩ, 400mA, SMD 0805; Manufacturer: Chilisin Elec; Manufacturer Part Number: CS0805-R10G-S; Self-Resonant Frequency: 500MHz; Q Factor: 65@150MHz; Package Size: 0805; JLCPCB Basic Part: No; JLCPCB Part Number: C285948; Supplier 1: LCSC; Category: Inductors; Supplier Part Number 1: C285948; Tolerance: ±2%; Rated Current: 400mA; DC Resistance: 460mΩ; RoHS: Yes; ComponentLink1Description: Datasheet; ComponentLink1URL: https://wmsc.lcsc.com/wmsc/upload/file/pdf/v2/lcsc/2304140030_Chilisin-Elec-CS0805-R10G-S_C285948.pdf; ComponentLink2Description: JLCPCB Part URL; ComponentLink2URL: https://jlcpcb.com/partdetail/C285948; ComponentLink3Description: LCSC Part URL; ComponentLink3URL: https://lcsc.com/product-detail/Inductors-SMD_Chilisin-Elec-Chilisin-Elec-CS0805-R10G-S_C285948.html
footprint IND-0805 (0805 (2012M) Inductor)
pins: 1, 2

## CS0805-R10J-S
designator L?  Inductance: 100nH
Inductor, 100nH, ±5%, 460mΩ, 400mA, SMD 0805; Manufacturer: Chilisin Elec; Manufacturer Part Number: CS0805-R10J-S; Self-Resonant Frequency: 500MHz; Q Factor: 65@150MHz; Package Size: 0805; JLCPCB Basic Part: No; JLCPCB Part Number: C280463; Supplier 1: LCSC; Category: Inductors; Supplier Part Number 1: C280463; Tolerance: ±5%; Rated Current: 400mA; DC Resistance: 460mΩ; RoHS: Yes; ComponentLink1Description: Datasheet; ComponentLink1URL: https://wmsc.lcsc.com/wmsc/upload/file/pdf/v2/lcsc/1810261322_Chilisin-Elec-CS0805-R10J-S_C280463.pdf; ComponentLink2Description: JLCPCB Part URL; ComponentLink2URL: https://jlcpcb.com/partdetail/C280463; ComponentLink3Description: LCSC Part URL; ComponentLink3URL: https://lcsc.com/product-detail/Inductors-SMD_Chilisin-Elec-Chilisin-Elec-CS0805-R10J-S_C280463.html
footprint IND-0805 (0805 (2012M) Inductor)
pins: 1, 2